# Altium footprint library 逸芬的库鸭.PcbLib: 255 footprints (part 5 of 20)
Each footprint in its own frame and in the unit in brackets; x right, y up, seen from the top. Pads: shape width x height; smd on the part's side, far side on the other; paste and mask are expansions set on the pad; w line width, h text height; cw(c..) or ccw(c..) is an arc to the next point about the centre after c.
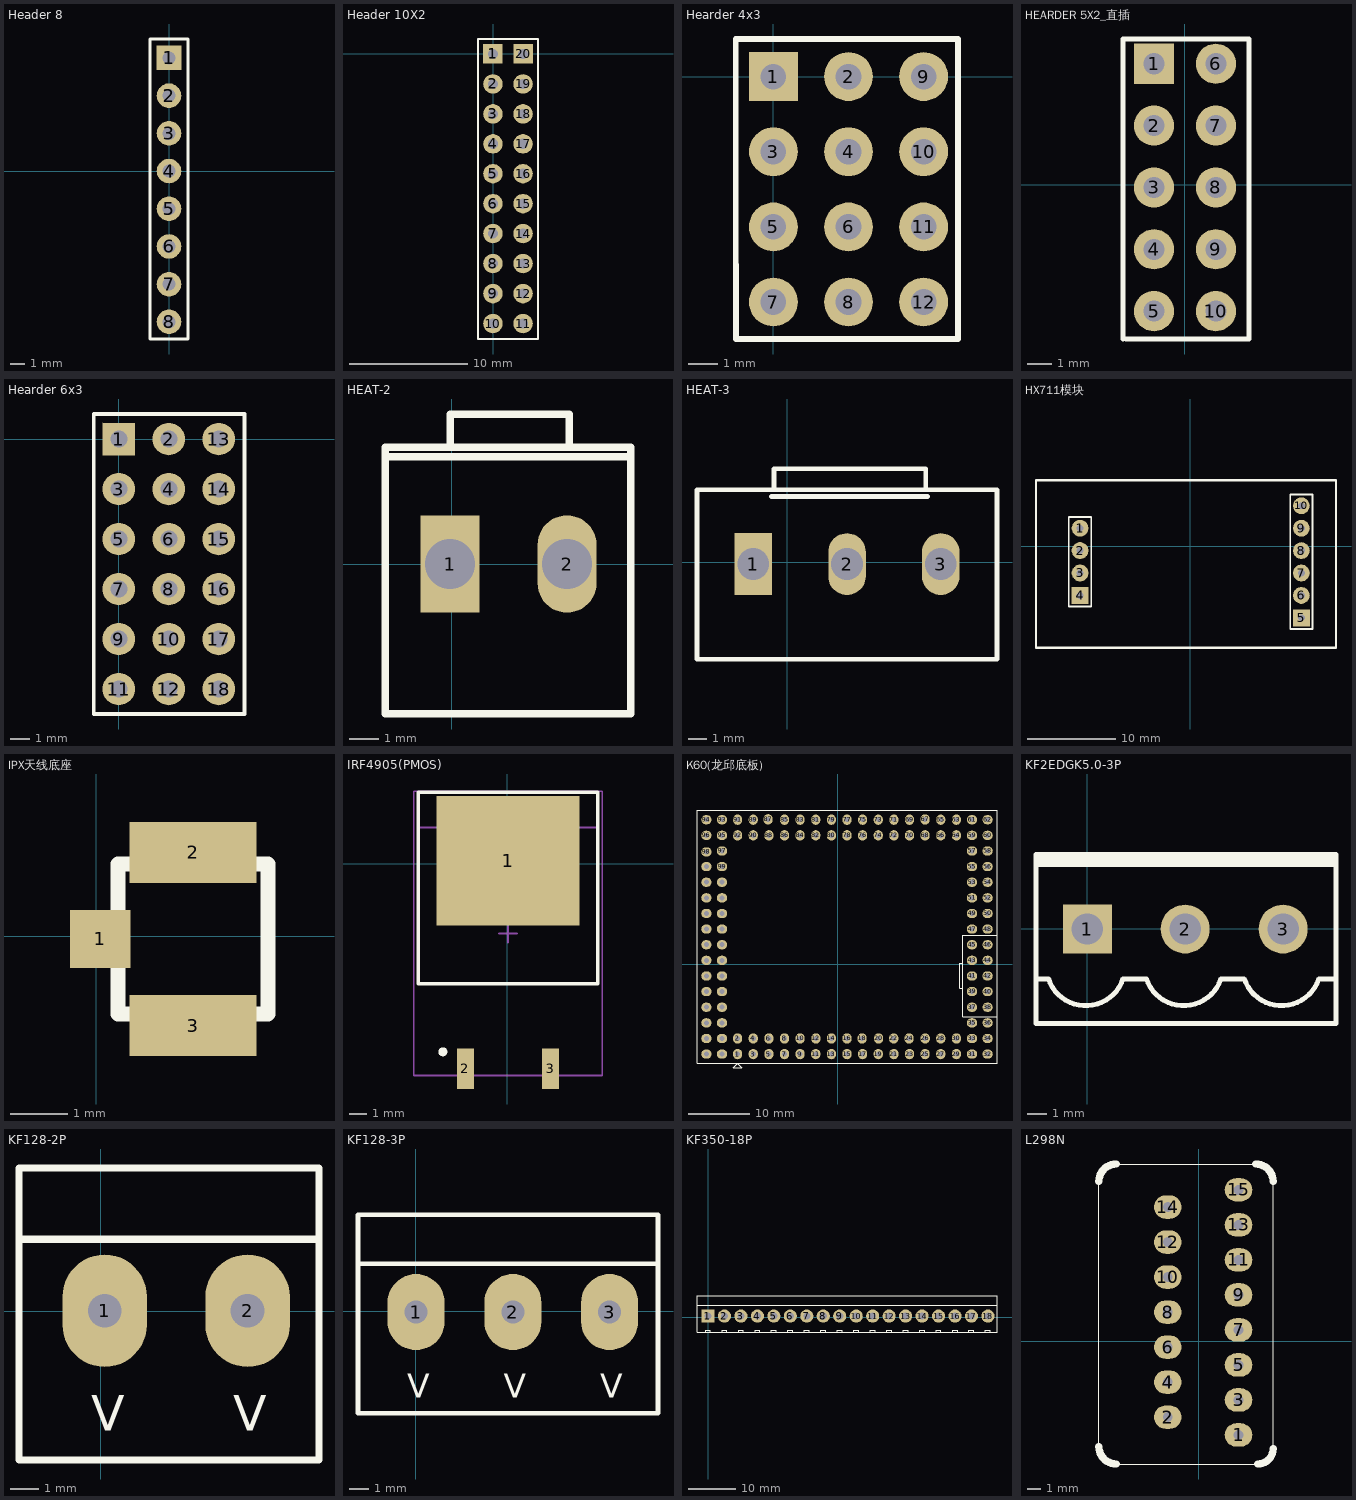
[diagram p4: the footprints below, top view; thin cyan lines are the x and y axes]

## Header 8 [mil]
pads (8):
  rect 65x65 hole 34: 1(0,300)
  round 65 hole 34: 2(0,200) 3(0,100) 4(0,0) 5(0,-99.8) 6(0,-199.8) 8(0,-399.61)
  round 65 hole 34 paste+0: 7(0,-299.61)
Top Overlay:
  lines w7.87: -50,-445 50,-445 50,350 -50,350 -50,-445
3D body "HDR1X8_2.54mm.STEP": height 336.22, standoff -118.11, extent -49,-451 51,349

## Header 10X2 [mil]
pads (20):
  rect 65x65 hole 34: 1(-0.98,-0.2) 20(99.41,-0.2)
  round 65 hole 34: 2(-0.98,-100.2) 3(-0.98,-200.2) 4(-0.98,-300.2) 5(-0.98,-400) 6(-0.98,-500) 8(-0.98,-699.8) 10(-0.98,-900.2) 11(99.41,-900.2) 13(99.41,-699.8) 15(99.41,-500) 16(99.41,-400) 17(99.41,-300.2) 18(99.41,-200.2) 19(99.41,-100.2)
  round 65 hole 34 paste+0: 7(-0.98,-599.8) 9(-0.98,-800.2) 12(99.41,-800.2) 14(99.41,-599.8)
Top Overlay:
  lines w7.87: 49.02,-951.77 -50.98,-951.77 -50.98,49.8 49.02,49.8 ; 49.41,-951.77 149.41,-951.77 149.41,49.8 49.41,49.8
3D body "HDR-1x2_H.STEP": height 200.79, standoff -118.11, extent -13.19,-547.83 492.72,-447.83
3D body "HDR-1x2_H.STEP": height 200.79, standoff -118.11, extent -13.19,-747.83 492.72,-647.83
3D body "HDR-1x2_H.STEP": height 200.79, standoff -118.11, extent -13.19,-647.83 492.72,-547.83
3D body "HDR-1x2_H.STEP": height 200.79, standoff -118.11, extent -13.19,-947.83 492.72,-847.83
3D body "HDR-1x2_H.STEP": height 200.79, standoff -118.11, extent -13.19,-847.83 492.72,-747.83
3D body "HDR-1x2_H.STEP": height 200.79, standoff -118.11, extent -13.19,-47.83 492.72,52.17
3D body "HDR-1x2_H.STEP": height 200.79, standoff -118.11, extent -13.19,-247.83 492.72,-147.83
3D body "HDR-1x2_H.STEP": height 200.79, standoff -118.11, extent -13.19,-147.83 492.72,-47.83
3D body "HDR-1x2_H.STEP": height 200.79, standoff -118.11, extent -13.19,-447.83 492.72,-347.83
3D body "HDR-1x2_H.STEP": height 200.79, standoff -118.11, extent -13.19,-347.83 492.72,-247.83

## Hearder 4x3 [mil]
pads (12):
  rect 65x65 hole 34: 1(0,0)
  round 65 hole 34: 2(100,0) 3(0,-100) 4(100,-100) 5(0,-200) 6(100,-200) 7(0,-300) 8(100,-300) 9(200,0) 10(200,-100) 11(200,-200) 12(200,-300)
Top Overlay:
  lines w7.87: -50,-58.33 -50,-250 -50,50 150,50
  lines w8: -50,-250 -50,-349.21 146.85,-349.21 246,-349.21 246,50 150,50
3D body "HDR1X4_2.54mm.STEP": height 336.22, standoff -118.11, extent -52.13,-352.61 47.87,47.39
3D body "HDR1X4_2.54mm.STEP": height 336.22, standoff -118.11, extent 47.87,-352.61 147.87,47.39
3D body "HDR1X4_2.54mm.STEP": height 336.22, standoff -118.11, extent 147.87,-352.61 247.87,47.39

## HEARDER 5X2_直插 [mil]
pads (10):
  rect 65x65 hole 34: 1(-50,196)
  round 65 hole 34: 2(-50,96) 3(-50,-4) 4(-50,-104) 5(-50,-204) 6(50,196) 7(50,96) 8(50,-4) 9(50,-104) 10(50,-204)
Top Overlay:
  lines w7.87: -100,-249 -100,236 103.43,236 103.43,-249 -95.43,-249
3D body "User Library-Hirose - DF11-10DP-2DSA(24) (Shrouded Header 2mm, 10 Pin).STEP": height 259.84, standoff -118.11, extent -94.43,-242 102.43,230.44

## Hearder 6x3 [mil]
pads (18):
  rect 65x65 hole 34: 1(0,0)
  round 65 hole 34: 2(100,0) 3(0,-100) 4(100,-100) 5(0,-200) 6(100,-200) 7(0,-300) 8(100,-300) 9(0,-400) 10(100,-400) 11(0,-500) 12(100,-500) 13(200,0) 14(200,-100) 15(200,-200) 16(200,-300) 17(200,-400) 18(200,-500)
Top Overlay:
  lines w7.87: -50,-358.33 -50,-550 ; -50,-58.33 -50,-250 ; 251,-550 -50,-550 ; 251,50 -50,50 -50,-250 ; -50,-550 -50,-250
  lines w8: 251,-550 251,50
3D body "61300621121.stp": height 338.19, standoff -116.14, extent -48.46,-552.48 151.54,-252.48
3D body "61300621121.stp": height 338.19, standoff -116.14, extent -48.46,-252.48 151.54,47.52
3D body "HDR1X6_2.54mm.STEP": height 336.22, standoff -118.11, extent 151.02,-553.8 251.02,46.2

## HEAT-2 [mm]
pads (2):
  rect 2x3.3 hole 1.7: 1(-0.051,0.007)
  oval 2x3.3 hole 1.7: 2(3.909,0.007)
Top Overlay:
  lines w0.254: -2.251,3.639 6.069,3.639 ; -0.051,3.967 -0.051,5.087 3.988,5.087 3.988,3.967 ; -2.251,-5.073 -2.251,3.967 6.069,3.967 6.069,-5.073 -2.251,-5.073
3D body "molex-22-27-2021.STEP": height 11.68, standoff -3.56, extent -0.47,-3.57 4.61,2.78

## HEAT-3 [mm]
pads (3):
  rect 2x3.3 hole 1.7: 1(-1.8,-0.1)
  oval 2x3.3 hole 1.7: 2(3.2,-0.1) 3(8.2,-0.1)
Top Overlay:
  lines w0.254: -0.82,3.5 7.5,3.5 ; -0.7,3.867 -0.7,4.987 2.359,4.987 4.378,4.987 7.4,4.987 7.4,3.867 ; -4.8,-5.173 11.2,-5.173 11.2,3.867 -4.8,3.867 -4.8,-5.173
3D body "molex-22-27-2031.STEP": height 11.68, standoff -3.56, extent -0.457,-3.734 7.163,2.616

## HX711模块 [mil]
pads (10):
  round 75 hole 30: 1(-492.49,81.19) 2(-492.49,-18.81) 3(-492.49,-118.81) 6(495.26,-219) 7(495.26,-119) 8(495.26,-19) 9(495.26,81) 10(495.26,181)
  rect 75x75 hole 30: 4(-492.49,-218.81) 5(495.26,-319)
Top Overlay:
  lines w7.87: -542.49,-268.81 -442.49,-268.81 -442.49,131.19 -542.49,131.19 -542.49,-268.81 ; 445.26,-369 545.26,-369 545.26,231 445.26,231 445.26,-369
  lines w10: -688.98,-452.76 649.61,-452.76 649.61,295.28 -688.98,295.28 -688.98,-452.76
3D body: height 336.22, standoff -118.11, extent 445.26,-368.99 545.26,231.01
3D body: height 336.22, standoff -118.11, extent -540.94,-262.99 -440.94,137.01
3D body: height 340, standoff 300, extent -669.29,-433.07 629.92,275.59

## IPX天线底座 [mm]
pads (3):
  rect 1.05x1 smd: 1(0.073,-0.048)
  rect 2.2x1.05 smd: 2(1.681,1.452) 3(1.681,-1.548)
Top Overlay:
  lines w0.254: 0.381,-1.348 2.981,-1.348 2.981,1.252 0.381,1.252 0.381,-1.348
3D body "User Library-1909763-1.STEP": height 1.3, standoff 0.02, extent 0.149,-1.574 2.999,1.426

## IRF4905(PMOS) [mm] "IRF4905"
pads (3):
  rect 8x7.2 smd: 1(0.047,0.174)
  rect 0.95x2.25 smd: 2(-2.333,-11.426) 3(2.427,-11.426)
Top Overlay:
  circle w0.25: c-3.585,-10.478 r0.125
  lines w0.2: -4.953,-6.676 5.047,-6.676 5.047,3.998 -4.953,3.998 -4.953,-6.676
Mechanical 13:
  lines w0.1: -4.953,-6.676 -4.953,2.024 5.047,2.024 5.047,-6.676 -4.953,-6.676
Mechanical 15:
  lines w0.1: -0.453,-3.876 0.547,-3.876 ; 0.047,-4.376 0.047,-3.376 ; -5.203,-11.801 -5.203,4.049 5.297,4.049 5.297,-11.801 -5.203,-11.801
3D body "User Library-DPAK-1.STEP": height 2.39, standoff -0.02, extent -3.323,-10.459 3.217,-0.52

## K60(龙邱底板) [mil]
pads (124):
  oval 59x66 hole 32: 1(-640,-575.68) 2(-640,-475.68) 3(-540,-575.68) 4(-540,-475.68) 5(-440,-575.68) 6(-440,-475.68) 7(-340,-575.68) 8(-340,-475.68) 9(-240,-575.68) 10(-240,-475.68) 11(-140,-575.68) 12(-139.21,-475.68) 13(-40,-575.68) 14(-40,-475.68) 15(60,-575.68) 16(60,-475.68) 17(160,-575.68) 18(156.85,-475.68) 19(260,-575.68) 20(262.36,-475.68) 21(360,-575.68) 22(358.82,-475.68) 23(460,-575.68) 24(457.64,-475.68) 25(560,-575.68) 26(560.39,-475.68) 27(660,-575.68) 28(660,-475.68) 29(760,-575.68) 30(760.39,-475.68) 63(760,924.32) 64(760,824.32) 65(660,924.32) 66(660,824.32) 67(560,926.29) 68(560,824.32) 69(460,924.32) 70(460,824.32) 71(360,924.32) 72(360,824.32) 73(260,924.32) 74(260,824.32) 75(160,924.32) 76(160,824.32) 77(60,924.32) 78(60,824.32) 79(-40,924.32) 80(-40,824.32) 81(-140,924.32) 82(-140,824.32) 83(-240,924.32) 84(-240,824.32) 85(-340,924.32) 86(-340,824.32) 87(-445.12,926.68) 88(-440,824.32) 89(-540,924.32) 90(-540,824.32) 91(-640,924.32) 92(-640,824.32)
  oval 66x59 hole 32: 31(860,-575.68) 32(960,-575.68) 33(860,-475.68) 34(960,-475.68) 35(860,-375.68) 36(960,-375.68) 37(860,-275.68) 38(960,-275.68) 39(860,-174.89) 40(960,-175.68) 41(860,-75.68) 42(960,-75.29) 43(860,24.32) 44(960,24.32) 45(860,124.32) 46(960,124.32) 47(860,224.32) 48(960,224.32) 49(860,324.32) 50(960,324.32) 51(860,424.32) 52(960,424.32) 53(860,524.32) 54(960,524.32) 55(860,624.32) 56(960,624.32) 57(860,724.32) 58(960,724.32) 59(860,824.32) 60(960,824.32) 61(860,924.32) 62(960,924.32) 93(-740,924.32) 94(-840,924.32) 95(-740,824.32) 96(-840,824.32) 97(-740,724.32) 98(-840,718.41) 99(-740,624.32) 100(-840,624.32) 101(-740,524.32) 102(-840,524.32) 103(-740,424.32) 104(-840,424.32) 105(-740,323.92) 106(-840,324.71) 107(-740,224.32) 108(-840,224.32) 109(-740,124.32) 110(-840,124.32) 111(-740,24.32) 112(-840,24.32) 113(-740,-75.68) 114(-840,-75.68) 115(-740,-175.68) 116(-840,-175.68) 117(-740,-275.68) 118(-840,-275.68) 119(-740,-375.68) 120(-840,-375.68) 121(-740,-475.68) 122(-840,-475.68) 123(-740,-575.68) 124(-840,-575.68)
Top Overlay:
  lines w5.91: 800,-155.68 780,-155.68 780,4.32 800,4.32 ; 1020,-335.68 800,-335.68 800,184.32 1020,184.32
  lines w7.87: -641.18,-634.74 -614.02,-662.3 -668.35,-662.3 -640.79,-634.74 ; -900,-635.68 -900,984.32 1020,984.32 1020,-635.68 -900,-635.68

## KF2EDGK5.0-3P [mm]
pads (3):
  rect 2.5x2.5 hole 1.6: 1(0,-0.025)
  round 2.5 hole 1.6: 2(5,-0.025) 3(10,-0.025)
Top Overlay:
  lines w0.254: -2.62,-2.565 -1.985,-2.565 ccw(c-0.08,-1.93) 1.825,-2.565 3.015,-2.565 ccw(c4.92,-1.93) 6.825,-2.565 8.015,-2.565 ccw(c9.92,-1.93) 11.825,-2.565 12.667,-2.565 ; -2.62,3.277 12.7,3.277 ; -2.62,3.531 12.7,3.531 ; -2.62,-4.851 -2.62,3.785 12.7,3.785 12.7,-4.851 -2.62,-4.851
3D body "KF2EDGK5.0-LI.STEP": height 11.25, standoff -2.95, extent 2.46,-4.783 7.54,3.717
3D body "KF2EDGK5.0-LI.STEP": height 11.25, standoff -2.95, extent -2.54,-4.783 2.54,3.717
3D body "KF2EDGK5.0-LI.STEP": height 11.25, standoff -2.95, extent 7.46,-4.783 12.54,3.717

## KF128-2P [mm]
pads (2):
  oval 3x4 hole 1.2: 1(0.134,0.024) 2(5.214,0.024)
Top Overlay:
  lines w0.254: -2.914,2.564 7.754,2.564 ; -2.914,-5.285 7.754,-5.285 7.754,5.1 -2.914,5.1 -2.914,-5.285
  text "V" at -0.347,-4.245 h1.27
  text "V" at 4.706,-4.245 h1.27
3D body "KF128-5.08-.STEP": height 14.15, standoff -3.95, extent 2.166,-5.353 7.746,5.147
3D body "KF128-5.08-.STEP": height 14.15, standoff -3.95, extent -2.914,-5.353 2.666,5.147

## KF128-3P [mm]
pads (3):
  oval 3x4 hole 1.2: 1(0.025,-0.05) 2(5.105,-0.05) 3(10.185,-0.05)
Top Overlay:
  lines w0.254: -3.023,2.49 12.725,2.49 ; -3.023,-5.359 -3.023,5.055 12.725,5.055 12.725,-5.359 -3.023,-5.359
  text "V" at -0.425,-4.545 h1.27
  text "V" at 4.628,-4.545 h1.27
  text "V" at 9.681,-4.545 h1.27
3D body "KF128-5.08-.STEP": height 14.15, standoff -3.95, extent -3.016,-5.434 2.564,5.066
3D body "KF128-5.08-.STEP": height 14.15, standoff -3.95, extent 2.064,-5.434 7.644,5.066
3D body "KF128-5.08-.STEP": height 14.15, standoff -3.95, extent 7.144,-5.434 12.724,5.066

## KF350-18P [mil]
pads (18):
  rect 110x110 hole 59.06: 1(-1.14,8.5)
  round 110 hole 59.06: 2(136.65,8.5) 3(274.45,8.51) 4(412.25,8.51) 5(550.04,8.51) 6(687.84,8.51) 7(825.63,8.5) 8(963.43,8.5) 9(1101.22,8.5) 10(1239.02,8.5) 11(1376.81,8.5) 12(1514.61,8.5) 13(1652.4,8.5) 14(1790.2,8.5) 15(1927.99,8.5) 16(2065.99,8.5) 17(2203.74,8.5) 18(2341.54,8.5)
Top Overlay:
  lines w10: -93.14,100.5 1039.86,100.5 1176.14,100.5 ; -21.14,-128.5 -21.14,-111.5 18.86,-111.5 18.86,-128.5 ; 116.65,-128.5 116.65,-111.5 156.65,-111.5 156.65,-128.5 ; 254.45,-128.49 254.45,-111.5 294.45,-111.5 294.45,-128.49 ; 392.25,-128.49 392.25,-111.5 432.25,-111.5 432.25,-128.49 ; 530.04,-128.49 530.04,-111.5 570.04,-111.5 570.04,-128.49 ; 667.86,-128.5 667.86,-111.5 707.86,-111.5 707.86,-128.5 ; 805.86,-128.5 805.86,-111.5 845.86,-111.5 845.86,-128.5 ; 943.86,-128.5 943.86,-111.5 983.86,-111.5 983.86,-128.5 ; 1081.65,-128.5 1081.65,-111.5 1121.65,-111.5 1121.65,-128.5 ; 1177.65,100.5 1313.94,100.5 ; 1219.45,-128.5 1219.45,-111.5 1259.45,-111.5 1259.45,-128.5 ; 1315.45,100.5 1451.73,100.5 ; 1357.25,-128.5 1357.25,-111.5 1397.25,-111.5 1397.25,-128.5 ; 1453.25,100.5 1589.53,100.5 ; 1495.04,-128.5 1495.04,-111.5 1535.04,-111.5 1535.04,-128.5 ; 1591.04,100.5 1727.32,100.5 ; 1632.84,-128.5 1632.84,-111.5 1672.84,-111.5 1672.84,-128.5 ; 1728.84,100.5 1865.12,100.5 ; 1770.63,-128.5 1770.63,-111.5 1810.63,-111.5 1810.63,-128.5 ; 1866.63,100.5 2002.91,100.5 ; 1908.43,-128.5 1908.43,-111.5 1948.43,-111.5 1948.43,-128.5 ; 1996.63,100.5 2416.34,100.39 ; 2046.43,-128.5 2046.43,-111.5 ; 2047.43,-111.5 2087.43,-111.5 2087.43,-128.5 ; 2181.27,-126.53 2181.27,-109.53 ; 2182.27,-109.53 2222.27,-109.53 2222.27,-126.53 ; 2319.06,-127.51 2319.06,-110.51 ; 2320.06,-110.51 2360.06,-110.51 2360.06,-127.51 ; -93.14,-128.5 -93.14,180.5 1039.86,180.5 1177.65,180.5 1315.45,180.5 1453.25,180.5 1591.04,180.5 1728.84,180.5 1866.63,180.5 2417.32,180.5 2417.32,-128.5 1866.63,-128.5 1728.84,-128.5 1591.04,-128.5 1453.25,-128.5 1315.45,-128.5 1177.65,-128.5 1039.86,-128.5 -93.14,-128.5

## L298N [mm]
pads (15):
  oval 2x1.7 hole 0.712: 1(2.87,-6.807) 2(-2.261,-5.512) 3(2.87,-4.267) 4(-2.261,-2.972) 5(2.87,-1.727) 6(-2.261,-0.432) 7(2.87,0.813) 8(-2.261,2.108) 9(2.87,3.353) 10(-2.261,4.648) 11(2.87,5.893) 12(-2.261,7.188) 13(2.87,8.433) 14(-2.261,9.728) 15(2.87,10.973)
Top Overlay:
  lines w0.076: -7.264,-7.645 -7.264,11.582 ; -5.994,-8.915 4.267,-8.915 ; -5.994,12.852 4.115,12.852 ; 5.385,-7.925 5.385,11.582
  lines w0.54: -7.264,-7.645 ccw(c-5.994,-7.645) -5.994,-8.915 ; -7.264,11.582 cw(c-5.994,11.582) -5.994,12.852 ; 4.115,12.852 cw(c4.115,11.582) 5.385,11.582 ; 4.267,-8.915 ccw(c4.267,-7.798) 5.385,-7.798
3D body "User Library-Multiwatt15V.STEP": height 21.3, standoff -1, extent -6.883,-7.666 3.007,11.934